# Altium footprint library iv_footprints.PcbLib: 724 footprints (part 3 of 46)
Each footprint in its own frame and in the unit in brackets; x right, y up, seen from the top. Pads: shape width x height; smd on the part's side, far side on the other; paste and mask are expansions set on the pad; w line width, h text height; cw(c..) or ccw(c..) is an arc to the next point about the centre after c.
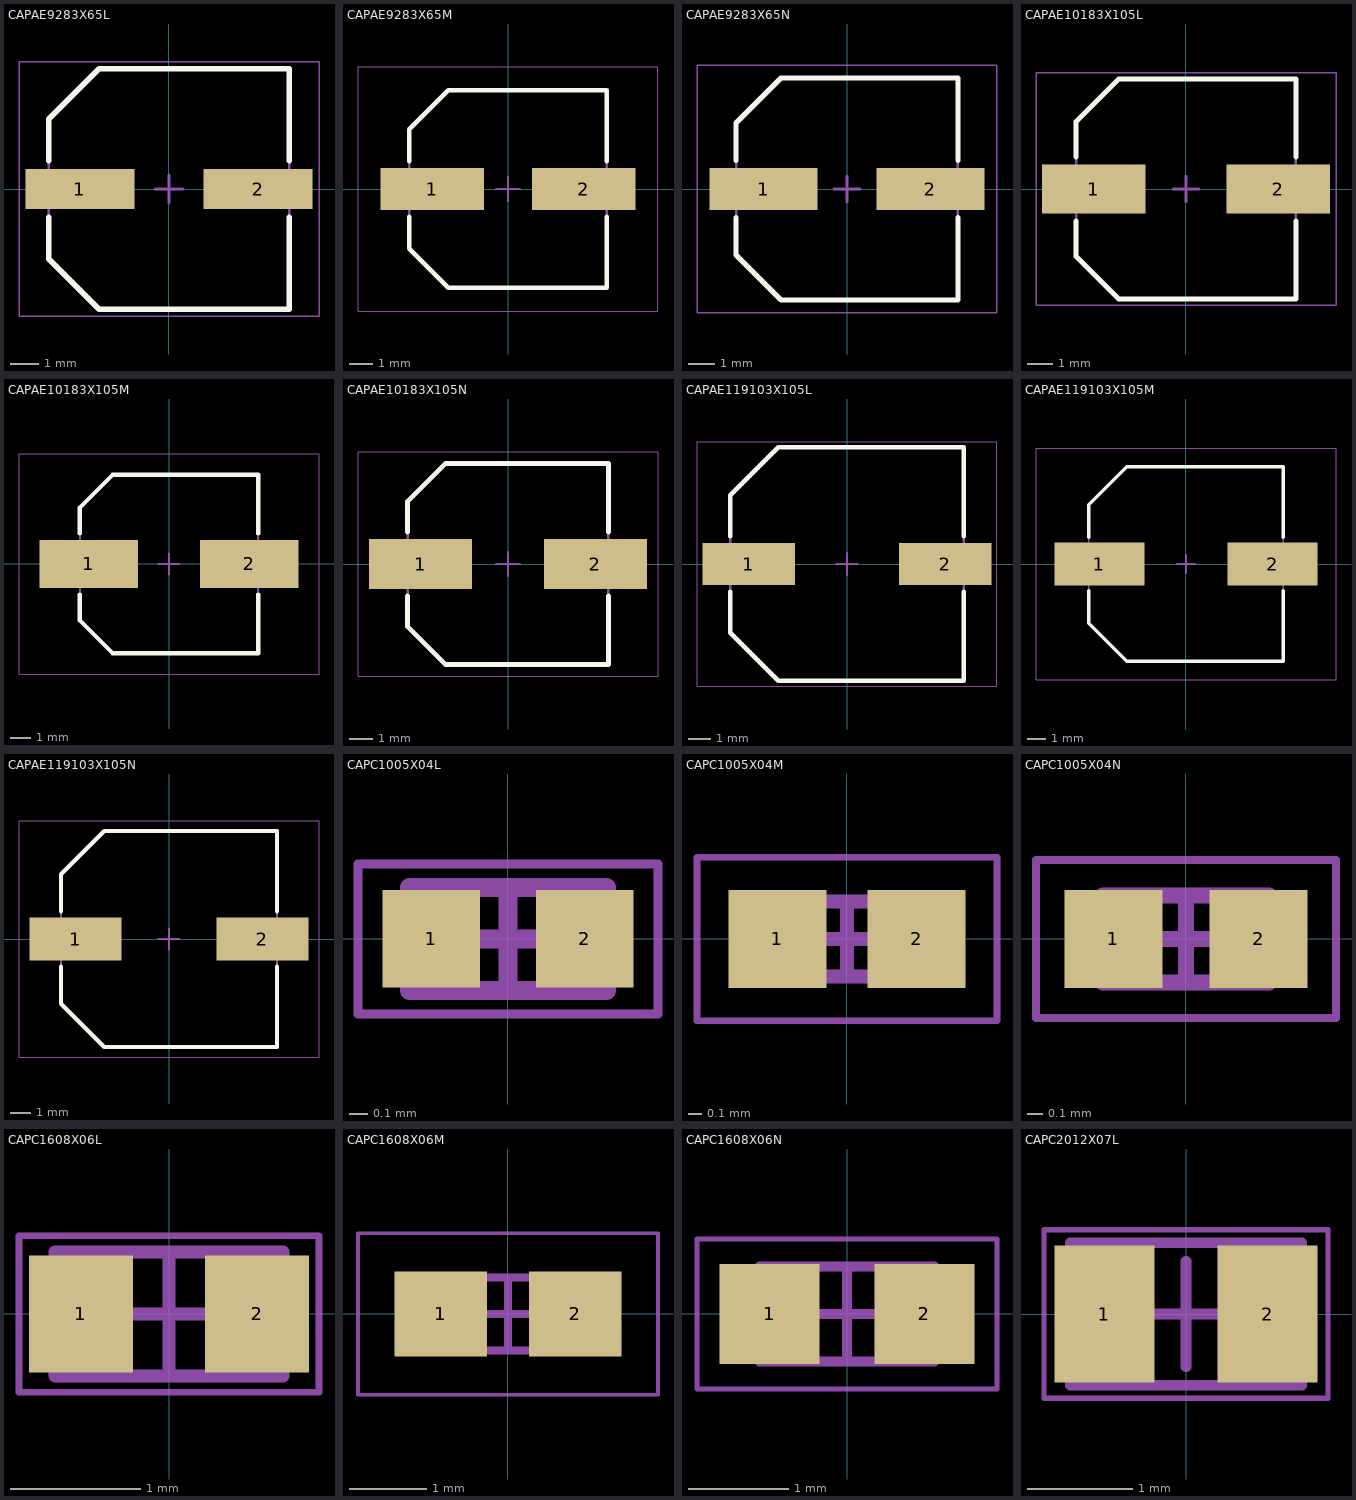
[diagram p2: the footprints below, top view; thin cyan lines are the x and y axes]

## CAPAE9283X65L [mm] "Aluminum Electrolytic Capacitor, Body 8,30x8,30x6,50mm, IPC High Density"
height 6.5
pads (2):
  rect 3.85x1.4 smd: 1(-3.15,0) 2(3.15,0)
Top Overlay:
  lines w0.2: -4.25,-1 -4.25,-2.475 -2.475,-4.25 4.25,-4.25 4.25,-1 ; -4.25,1 -4.25,2.475 -2.475,4.25 4.25,4.25 4.25,1
Mechanical 13:
  lines w0.1: -4.25,-2.475 -4.25,2.475 -2.475,4.25 4.25,4.25 4.25,-4.25 -2.475,-4.25 -4.25,-2.475
Mechanical 15:
  lines w0.05: -5.3,-4.5 5.3,-4.5 5.3,4.5 -5.3,4.5 -5.3,-4.5
  lines w0.1: -0.5,0 0.5,0 ; 0,-0.5 0,0.5
3D body "CAPAE9283X65L.step": height 6.5, standoff -1.5, extent -4.625,-4.25 4.625,4.25

## CAPAE9283X65M [mm] "Aluminum Electrolytic Capacitor, Body 8,30x8,30x6,50mm, IPC Low Density"
height 6.5
pads (2):
  rect 4.45x1.8 smd: 1(-3.25,0) 2(3.25,0)
Top Overlay:
  lines w0.2: -4.25,-1.2 -4.25,-2.575 -2.575,-4.25 4.25,-4.25 4.25,-1.2 ; -4.25,1.2 -4.25,2.575 -2.575,4.25 4.25,4.25 4.25,1.2
Mechanical 13:
  lines w0.1: -4.25,-2.575 -4.25,2.575 -2.575,4.25 4.25,4.25 4.25,-4.25 -2.575,-4.25 -4.25,-2.575
Mechanical 15:
  lines w0.05: -6.45,-5.25 6.45,-5.25 6.45,5.25 -6.45,5.25 -6.45,-5.25
  lines w0.1: -0.5,0 0.5,0 ; 0,-0.5 0,0.5
3D body "CAPAE9283X65M.step": height 6.5, standoff -1.5, extent -4.625,-4.25 4.625,4.25

## CAPAE9283X65N [mm] "Aluminum Electrolytic Capacitor, Body 8,30x8,30x6,50mm, IPC Medium Density"
height 6.5
pads (2):
  rect 4.15x1.6 smd: 1(-3.2,0) 2(3.2,0)
Top Overlay:
  lines w0.2: -4.25,-1.1 -4.25,-2.525 -2.525,-4.25 4.25,-4.25 4.25,-1.1 ; -4.25,1.1 -4.25,2.525 -2.525,4.25 4.25,4.25 4.25,1.1
Mechanical 13:
  lines w0.1: -4.25,-2.525 -2.525,-4.25 4.25,-4.25 4.25,4.25 -2.525,4.25 -4.25,2.525 -4.25,-2.525
Mechanical 15:
  lines w0.05: -5.75,-4.75 -5.75,4.75 5.75,4.75 5.75,-4.75 -5.75,-4.75
  lines w0.1: -0.5,0 0.5,0 ; 0,-0.5 0,0.5
3D body "CAPAE9283X65N.step": height 6.5, standoff -1.5, extent -4.625,-4.25 4.625,4.25

## CAPAE10183X105L [mm] "Aluminum Electrolytic Capacitor, Body 8,30x8,30x10,50mm, IPC High Density"
height 10.5
pads (2):
  rect 4x1.9 smd: 1(-3.575,0) 2(3.575,0)
Top Overlay:
  lines w0.2: -4.25,-1.25 -4.25,-2.6 -2.6,-4.25 4.25,-4.25 4.25,-1.25 ; -4.25,1.25 -4.25,2.6 -2.6,4.25 4.25,4.25 4.25,1.25
Mechanical 13:
  lines w0.1: -4.25,-2.6 -2.6,-4.25 4.25,-4.25 4.25,4.25 -2.6,4.25 -4.25,2.6 -4.25,-2.6
Mechanical 15:
  lines w0.05: -5.8,-4.5 -5.8,4.5 5.8,4.5 5.8,-4.5 -5.8,-4.5
  lines w0.1: -0.5,0 0.5,0 ; 0,-0.5 0,0.5
3D body "CAPAE10183X105L.step": height 10.5, standoff 0, extent -5.05,-4.25 5.05,4.25

## CAPAE10183X105M [mm] "Aluminum Electrolytic Capacitor, Body 8,30x8,30x10,50mm, IPC Low Density"
height 10.5
pads (2):
  rect 4.7x2.3 smd: 1(-3.825,0) 2(3.825,0)
Top Overlay:
  lines w0.2: -4.25,-1.45 -4.25,-2.7 -2.7,-4.25 4.25,-4.25 4.25,-1.45 ; -4.25,1.45 -4.25,2.7 -2.7,4.25 4.25,4.25 4.25,1.45
Mechanical 13:
  lines w0.1: -4.25,-2.7 -4.25,2.7 -2.7,4.25 4.25,4.25 4.25,-4.25 -2.7,-4.25 -4.25,-2.7
Mechanical 15:
  lines w0.05: -7.15,-5.25 7.15,-5.25 7.15,5.25 -7.15,5.25 -7.15,-5.25
  lines w0.1: -0.5,0 0.5,0 ; 0,-0.5 0,0.5
3D body "CAPAE10183X105M.step": height 10.5, standoff 0, extent -5.05,-4.25 5.05,4.25

## CAPAE10183X105N [mm] "Aluminum Electrolytic Capacitor, Body 8,30x8,30x10,50mm, IPC Medium Density"
height 10.5
pads (2):
  rect 4.35x2.1 smd: 1(-3.7,0) 2(3.7,0)
Top Overlay:
  lines w0.2: -4.25,-1.35 -4.25,-2.65 -2.65,-4.25 4.25,-4.25 4.25,-1.35 ; -4.25,1.35 -4.25,2.65 -2.65,4.25 4.25,4.25 4.25,1.35
Mechanical 13:
  lines w0.1: -4.25,-2.65 -4.25,2.65 -2.65,4.25 4.25,4.25 4.25,-4.25 -2.65,-4.25 -4.25,-2.65
Mechanical 15:
  lines w0.05: -6.35,-4.75 6.35,-4.75 6.35,4.75 -6.35,4.75 -6.35,-4.75
  lines w0.1: -0.5,0 0.5,0 ; 0,-0.5 0,0.5
3D body "CAPAE10183X105N.step": height 10.5, standoff 0, extent -5.05,-4.25 5.05,4.25

## CAPAE119103X105L [mm] "Aluminum Electrolytic Capacitor, Body 10,30x10,30x10,50mm, IPC High Density"
height 10.5
pads (2):
  rect 4.15x1.9 smd: 1(-4.425,0) 2(4.425,0)
Top Overlay:
  lines w0.2: -5.25,-1.25 -5.25,-3.1 -3.1,-5.25 5.25,-5.25 5.25,-1.25 ; -5.25,1.25 -5.25,3.1 -3.1,5.25 5.25,5.25 5.25,1.25
Mechanical 13:
  lines w0.1: -5.25,-3.1 -5.25,3.1 -3.1,5.25 5.25,5.25 5.25,-5.25 -3.1,-5.25 -5.25,-3.1
Mechanical 15:
  lines w0.05: -6.75,-5.5 6.75,-5.5 6.75,5.5 -6.75,5.5 -6.75,-5.5
  lines w0.1: -0.5,0 0.5,0 ; 0,-0.5 0,0.5
3D body "CAPAE119103X105L.step": height 10.5, standoff 0, extent -5.95,-5.25 5.95,5.25

## CAPAE119103X105M [mm] "Aluminum Electrolytic Capacitor, Body 10,30x10,30x10,50mm, IPC Low Density"
height 10.5
pads (2):
  rect 4.85x2.3 smd: 1(-4.675,0) 2(4.675,0)
Top Overlay:
  lines w0.2: -5.25,-1.45 -5.25,-3.2 -3.2,-5.25 5.25,-5.25 5.25,-1.45 ; -5.25,1.45 -5.25,3.2 -3.2,5.25 5.25,5.25 5.25,1.45
Mechanical 13:
  lines w0.1: -5.25,-3.2 -5.25,3.2 -3.2,5.25 5.25,5.25 5.25,-5.25 -3.2,-5.25 -5.25,-3.2
Mechanical 15:
  lines w0.05: -8.1,-6.25 8.1,-6.25 8.1,6.25 -8.1,6.25 -8.1,-6.25
  lines w0.1: -0.5,0 0.5,0 ; 0,-0.5 0,0.5
3D body "CAPAE119103X105M.step": height 10.5, standoff 0, extent -5.95,-5.25 5.95,5.25

## CAPAE119103X105N [mm] "Aluminum Electrolytic Capacitor, Body 10,30x10,30x10,50mm, IPC Medium Density"
height 10.5
pads (2):
  rect 4.5x2.1 smd: 1(-4.55,0) 2(4.55,0)
Top Overlay:
  lines w0.2: -5.25,-1.35 -5.25,-3.15 -3.15,-5.25 5.25,-5.25 5.25,-1.35 ; -5.25,1.35 -5.25,3.15 -3.15,5.25 5.25,5.25 5.25,1.35
Mechanical 13:
  lines w0.1: -5.25,-3.15 -5.25,3.15 -3.15,5.25 5.25,5.25 5.25,-5.25 -3.15,-5.25 -5.25,-3.15
Mechanical 15:
  lines w0.05: -7.3,-5.75 7.3,-5.75 7.3,5.75 -7.3,5.75 -7.3,-5.75
  lines w0.1: -0.5,0 0.5,0 ; 0,-0.5 0,0.5
3D body "CAPAE119103X105N.step": height 10.5, standoff 0, extent -5.95,-5.25 5.95,5.25

## CAPC1005X04L [mm] "Chip Capacitor, 2-Leads, Body 1,00x0,50mm, IPC High Density"
height 0.4
pads (2):
  rect 0.52x0.52 smd: 1(-0.41,0) 2(0.41,0)
Mechanical 13:
  lines w0.1: -0.525,-0.275 -0.525,0.275 0.525,0.275 0.525,-0.275 -0.525,-0.275
Mechanical 15:
  lines w0.05: -0.8,-0.4 -0.8,0.4 0.8,0.4 0.8,-0.4 -0.8,-0.4
  lines w0.1: -0.275,0 0.275,0 ; 0,-0.275 0,0.275
3D body: height 0.4, standoff 0, extent -0.275,-0.275 0.275,0.275
3D body: height 0.4, standoff 0, extent -0.525,-0.275 -0.275,0.275
3D body: height 0.4, standoff 0, extent 0.275,-0.275 0.525,0.275

## CAPC1005X04M [mm] "Chip Capacitor, 2-Leads, Body 1,00x0,50mm, IPC Low Density"
height 0.4
pads (2):
  rect 0.72x0.72 smd: 1(-0.51,0) 2(0.51,0)
Mechanical 13:
  lines w0.1: -0.525,-0.275 0.525,-0.275 0.525,0.275 -0.525,0.275 -0.525,-0.275
Mechanical 15:
  lines w0.05: -1.1,-0.6 1.1,-0.6 1.1,0.6 -1.1,0.6 -1.1,-0.6
  lines w0.1: -0.275,0 0.275,0 ; 0,-0.275 0,0.275
3D body: height 0.4, standoff 0, extent 0.275,-0.275 0.525,0.275
3D body: height 0.4, standoff 0, extent -0.525,-0.275 -0.275,0.275
3D body: height 0.4, standoff 0, extent -0.275,-0.275 0.275,0.275

## CAPC1005X04N [mm] "Chip Capacitor, 2-Leads, Body 1,00x0,50mm, IPC Medium Density"
height 0.4
pads (2):
  rect 0.62x0.62 smd: 1(-0.46,0) 2(0.46,0)
Mechanical 13:
  lines w0.1: -0.525,-0.275 -0.525,0.275 0.525,0.275 0.525,-0.275 -0.525,-0.275
Mechanical 15:
  lines w0.05: -0.95,-0.5 -0.95,0.5 0.95,0.5 0.95,-0.5 -0.95,-0.5
  lines w0.1: -0.275,0 0.275,0 ; 0,-0.275 0,0.275
3D body: height 0.4, standoff 0, extent -0.275,-0.275 0.275,0.275
3D body: height 0.4, standoff 0, extent -0.525,-0.275 -0.275,0.275
3D body: height 0.4, standoff 0, extent 0.275,-0.275 0.525,0.275

## CAPC1608X06L [mm] "Chip Capacitor, 2-Leads, Body 1,60x0,85mm, IPC High Density"
height 0.55
pads (2):
  rect 0.8x0.9 smd: 1(-0.675,0) 2(0.675,0)
Mechanical 13:
  lines w0.1: -0.875,-0.475 -0.875,0.475 0.875,0.475 0.875,-0.475 -0.875,-0.475
Mechanical 15:
  lines w0.05: -1.15,-0.6 -1.15,0.6 1.15,0.6 1.15,-0.6 -1.15,-0.6
  lines w0.1: -0.475,0 0.475,0 ; 0,-0.475 0,0.475
3D body: height 0.55, standoff 0, extent -0.575,-0.475 0.575,0.475
3D body: height 0.55, standoff 0, extent -0.875,-0.475 -0.575,0.475
3D body: height 0.55, standoff 0, extent 0.575,-0.475 0.875,0.475

## CAPC1608X06M [mm] "Chip Capacitor, 2-Leads, Body 1,60x0,85mm, IPC Low Density"
height 0.55
pads (2):
  rect 1.2x1.1 smd: 1(-0.875,0) 2(0.875,0)
Mechanical 13:
  lines w0.1: -0.875,-0.475 0.875,-0.475 0.875,0.475 -0.875,0.475 -0.875,-0.475
Mechanical 15:
  lines w0.05: -1.95,-1.05 1.95,-1.05 1.95,1.05 -1.95,1.05 -1.95,-1.05
  lines w0.1: -0.475,0 0.475,0 ; 0,-0.475 0,0.475
3D body: height 0.55, standoff 0, extent 0.575,-0.475 0.875,0.475
3D body: height 0.55, standoff 0, extent -0.875,-0.475 -0.575,0.475
3D body: height 0.55, standoff 0, extent -0.575,-0.475 0.575,0.475

## CAPC1608X06N [mm] "Chip Capacitor, 2-Leads, Body 1,60x0,85mm, IPC Medium Density"
height 0.55
pads (2):
  rect 1x1 smd: 1(-0.775,0) 2(0.775,0)
Mechanical 13:
  lines w0.1: -0.875,-0.475 -0.875,0.475 0.875,0.475 0.875,-0.475 -0.875,-0.475
Mechanical 15:
  lines w0.05: -1.5,-0.75 -1.5,0.75 1.5,0.75 1.5,-0.75 -1.5,-0.75
  lines w0.1: -0.475,0 0.475,0 ; 0,-0.475 0,0.475
3D body: height 0.55, standoff 0, extent -0.575,-0.475 0.575,0.475
3D body: height 0.55, standoff 0, extent -0.875,-0.475 -0.575,0.475
3D body: height 0.55, standoff 0, extent 0.575,-0.475 0.875,0.475

## CAPC2012X07L [mm] "Chip Capacitor, 2-Leads, Body 2,00x1,25mm, IPC High Density"
height 0.7
pads (2):
  rect 0.95x1.3 smd: 1(-0.775,0) 2(0.775,0)
Mechanical 13:
  lines w0.1: -1.1,-0.675 1.1,-0.675 1.1,0.675 -1.1,0.675 -1.1,-0.675
Mechanical 15:
  lines w0.05: -1.35,-0.8 1.35,-0.8 1.35,0.8 -1.35,0.8 -1.35,-0.8
  lines w0.1: -0.5,0 0.5,0 ; 0,-0.5 0,0.5
3D body: height 0.7, standoff 0, extent 0.7,-0.675 1.1,0.675
3D body: height 0.7, standoff 0, extent -1.1,-0.675 -0.7,0.675
3D body: height 0.7, standoff 0, extent -0.7,-0.675 0.7,0.675